# Altium footprint library User.PcbLib: 317 footprints (part 10 of 20)
Each footprint in its own frame and in the unit in brackets; x right, y up, seen from the top. Pads: shape width x height; smd on the part's side, far side on the other; paste and mask are expansions set on the pad; w line width, h text height; cw(c..) or ccw(c..) is an arc to the next point about the centre after c.
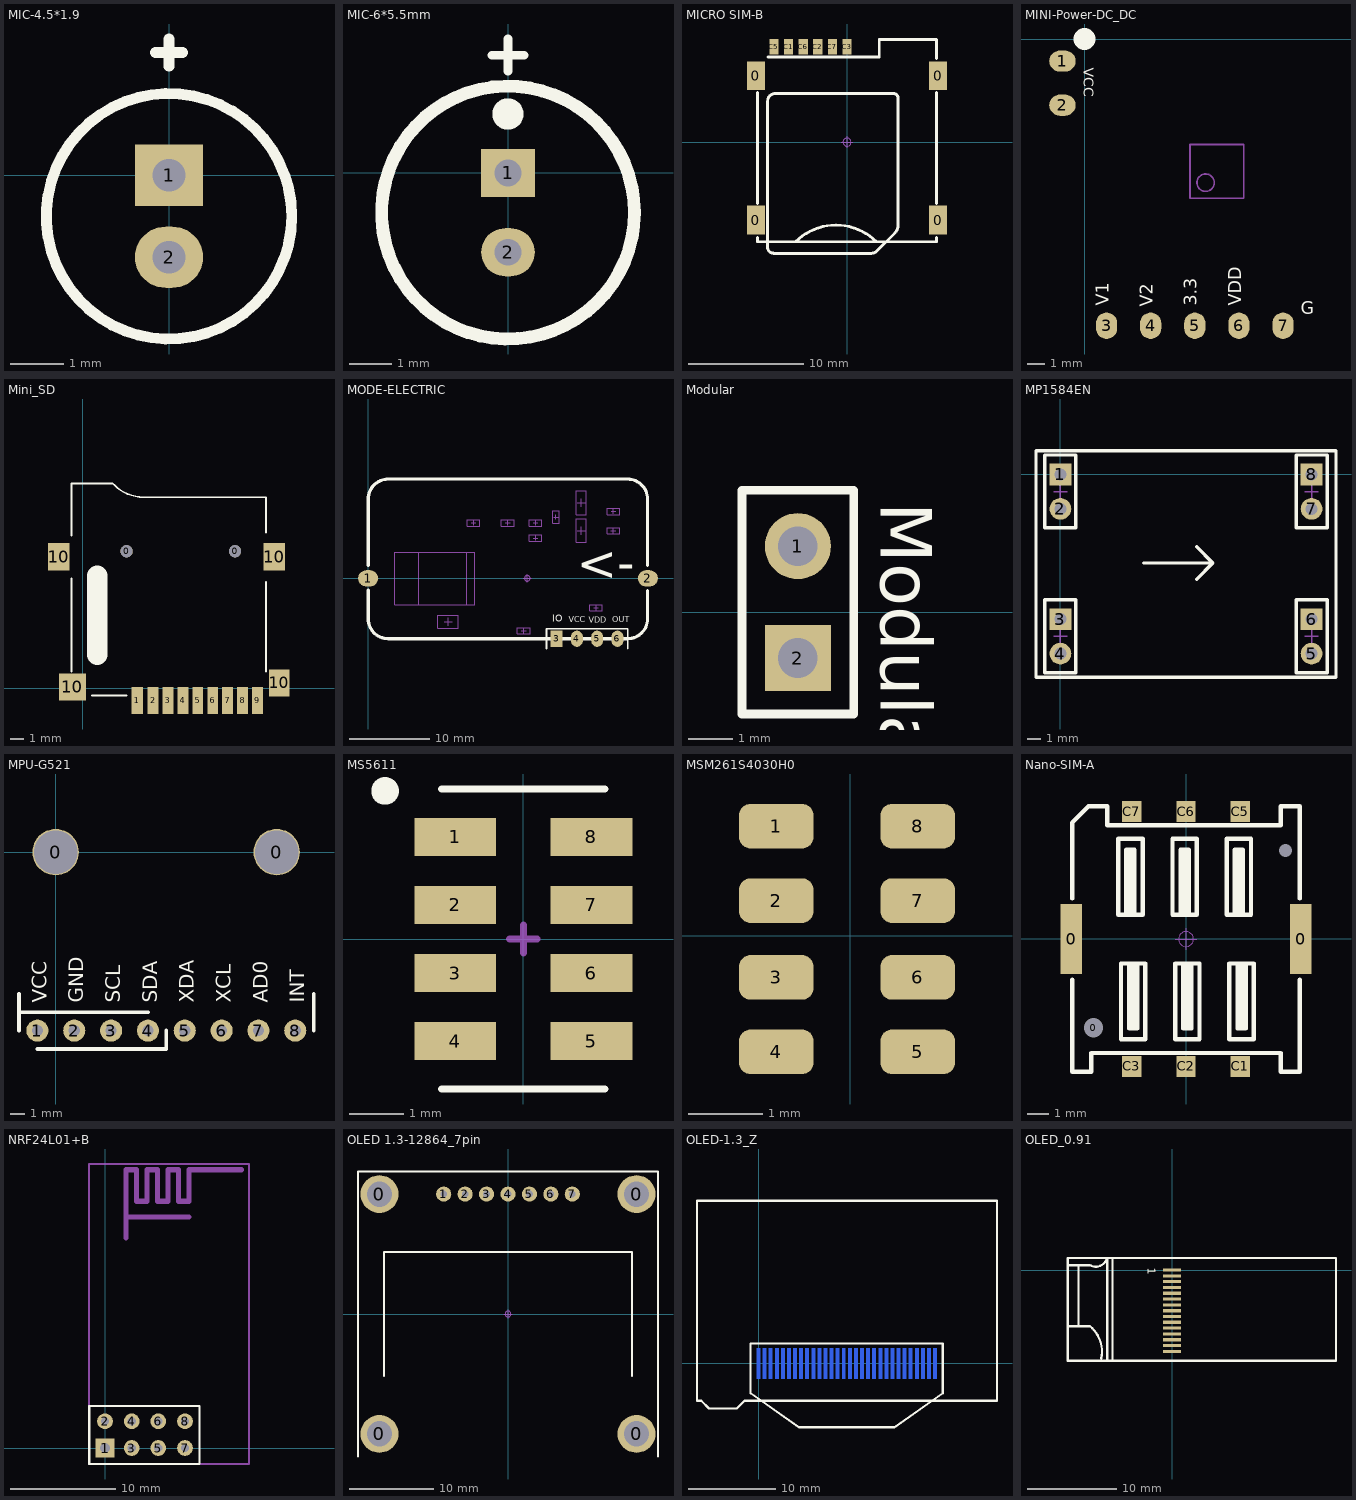
[diagram p9: the footprints below, top view; thin cyan lines are the x and y axes]

## MIC-4.5*1.9 [mil] "咪咪头"
pads (2):
  rect 50x45 hole 24: 1(0,0)
  oval 50x45 hole 24: 2(0,-60)
Top Overlay:
  circle w8: c0,-30 r90
  lines w8: -10,90 10,90 ; 0,80 0,100
3D body "MIC4.5X1.9.stp": height 75.38, standoff -110.24, extent -88.81,-118.58 88,58.58

## MIC-6*5.5mm [mil] "咪咪头"
pads (2):
  rect 50x45 hole 25: 1(0,0)
  oval 50x45 hole 25: 2(0,-74)
Top Overlay:
  circle w15: c0,55 r7.07
  circle w12: c0,-37 r118
  lines w8: -15,110 15,110 ; 0,95 0,125
3D body "MIC6X5.5mm.stp": height 197.64, standoff -118.11, extent -117.78,-157.1 117.78,79.12

## MICRO SIM-B [mm]
pads (10):
  rect 1.55x2.5 smd: 0(-7.9,-6.757) 0(-7.9,5.763) 0(7.9,-6.757) 0(7.9,5.763)
  rect 0.8x1.35 smd: C1(-5.07,8.268) C2(-2.53,8.268) C3(0.01,8.268) C5(-6.34,8.268) C6(-3.8,8.268) C7(-1.26,8.268)
Top Overlay:
  lines w0.254: -7.747,-8.255 -7.747,-8.636 7.747,-8.636 7.747,-8.255 ; -7.747,-5.334 -7.747,4.318 ; -6.858,7.366 2.794,7.366 2.794,8.89 7.747,8.89 7.747,7.239 ; -6.381,-9.636 2.136,-9.636 ccw(c2.136,-9.023) 2.57,-9.456 4.153,-7.873 ccw(c3.502,-7.223) 4.422,-7.223 4.422,-6.334 4.422,3.826 ccw(c4.041,3.826) 4.041,4.207 3.406,4.207 ; -6.381,-9.628 cw(c-6.381,-9.128) -6.881,-9.128 -6.881,3.572 cw(c-6.246,3.572) -6.246,4.207 3.787,4.207 ; -4.445,-8.636 cw(c-0.953,-12.128) 2.54,-8.636 ; 7.747,-5.334 7.747,4.318
Mechanical 15:
  circle w0.05: c0,0 r0.35
  lines w0.05: -0.5,0 0.5,0 ; 0,-0.5 0,0.5
3D body "MICRO SIM-B.STEP": height 1.4, standoff 0.03, extent -8.27,-8.5 8.27,8.72

## MINI-Power-DC_DC [mil] "4 Ch"
pads (7):
  oval 60x48 smd: 1(-50,-50) 2(-50,-150)
  oval 48x60 smd: 3(50,-650) 4(150,-650) 5(250,-650) 6(350,-650) 7(450,-650)
Top Overlay:
  lines w50: 0,0 0,0
  text "VDD" at 365.7,-605 h50
  text "V1" at 65,-605 h50
  text "V2" at 164.86,-606.85 h50
  text "G" at 490.05,-634.54 h50
  text "3.3" at 264.54,-605 h50
  text "VCC" at -9.63,-65 h40
Mechanical 13:
  circle w3.94: c274.41,-325.59 r19.68
  lines w3.94: 238.98,-361.02 238.98,-238.98 361.02,-238.98 361.02,-361.02 238.98,-361.02
3D body: height 19.68, standoff 0, extent -50,-650 650,50
3D body "User Library-0603 SMD Capacitor.STEP": height 31.57, standoff 19.68, extent 574.2,-565.2 605.7,-502.21
3D body "SOD123.STEP": height 69.69, standoff 19.68, extent 58.51,-162.84 121.5,-17.17
3D body "SOT23-5R.STEP": height 70.87, standoff 19.68, extent 410.31,-589.45 528.42,-471.34
3D body "QFN40P300X300X80_HS-21N.step": height 51.18, standoff 19.68, extent 238.58,-361.41 361.41,-238.58
3D body "RESC1608(0603).STEP": height 34.65, standoff 19.68, extent 574.25,-71.49 605.74,-8.5
3D body "RESC1608(0603).STEP": height 34.65, standoff 19.68, extent 98.5,-515.75 161.49,-484.26
3D body "RESC1608(0603).STEP": height 34.65, standoff 19.68, extent 98.5,-445.75 161.49,-414.26
3D body "RESC1608(0603).STEP": height 34.65, standoff 19.68, extent 239.77,-446.77 302.76,-415.27
3D body "RESC1608(0603).STEP": height 34.65, standoff 19.68, extent 437.24,-446.77 500.24,-415.27
3D body "RESC1608(0603).STEP": height 34.65, standoff 19.68, extent 154.25,-162.75 185.74,-99.76
3D body "RESC1608(0603).STEP": height 34.65, standoff 19.68, extent 224.25,-161.49 255.74,-98.5
3D body "LED0603(R).STEP": height 43.31, standoff 19.68, extent 574.26,-201.89 605.75,-138.11
3D body "NR2520.STEP": height 65.75, standoff 22.44, extent 77.29,-370.87 175.71,-292.13
3D body "NR2520.STEP": height 65.75, standoff 22.44, extent 424.29,-370.86 522.71,-292.12
3D body "NR2520.STEP": height 65.75, standoff 22.44, extent 292.12,-175.71 370.86,-77.29
3D body "User Library-0603 SMD Capacitor.STEP": height 31.57, standoff 19.68, extent -5.7,-450.2 25.8,-387.2
3D body "User Library-0603 SMD Capacitor.STEP": height 31.57, standoff 19.68, extent -5.8,-281.8 25.7,-218.81
3D body "User Library-0603 SMD Capacitor.STEP": height 31.57, standoff 19.68, extent 93.8,-245.8 156.8,-214.3
3D body "User Library-0603 SMD Capacitor.STEP": height 31.57, standoff 19.68, extent 414.2,-196.8 445.7,-133.81
3D body "User Library-0603 SMD Capacitor.STEP": height 31.57, standoff 19.68, extent 574.3,-396.2 605.8,-333.2
3D body "User Library-0603 SMD Capacitor.STEP": height 31.57, standoff 19.68, extent 494.2,-197.8 525.7,-134.81
3D body "User Library-0603 SMD Capacitor.STEP": height 31.57, standoff 19.68, extent 334.2,-565.2 365.7,-502.21
3D body "User Library-0603 SMD Capacitor.STEP": height 31.57, standoff 19.68, extent 173.8,-45.8 236.8,-14.3
3D body "User Library-0603 SMD Capacitor.STEP": height 31.57, standoff 19.68, extent 433.2,-65.7 496.19,-34.2

## Mini_SD [mm]
pads (15):
  round 0.9 hole 0.9 unplated: 0(3.251,10.088) 0(11.251,10.088)
  rect 0.85x2 smd: 1(4.051,-0.912)
  rect 0.8x2 smd: 2(5.201,-0.912) 3(6.301,-0.912) 4(7.401,-0.912) 5(8.501,-0.912) 6(9.601,-0.912) 7(10.701,-0.912) 8(11.801,-0.912) 9(12.901,-0.912)
  rect 1.6x2 smd: 10(-1.749,9.688) 10(14.151,9.688)
  rect 2x2 smd: 10(-0.749,0.088)
  rect 1.5x2 smd: 10(14.501,0.388)
Top Overlay:
  lines w0.127: -0.814,11.231 -0.814,14.088 ; -0.814,13.771 -0.814,15.088 2.235,15.088 2.337,14.986 ccw(c4.505,17.154) 4.505,14.088 5.791,14.088 13.537,14.088 13.537,11.485 ; -0.811,1.226 -0.811,8.084 ; 13.54,1.226 13.54,7.83
  lines w0.15: 0.713,-0.552 3.253,-0.552
  lines w1.5: 1.092,2.468 1.092,8.31
3D body "User Library-Micro SD.STEP": height 2.07, standoff -0.4, extent -2.002,-1.152 14.304,14.058

## MODE-ELECTRIC [mil]
pads (6):
  oval 100x80 smd: 1(0,0) 2(1380,0)
  rect 59.06x80 smd: 3(930,-298)
  oval 59.06x80 smd: 4(1030,-298) 5(1130,-298) 6(1230,-298)
Top Overlay:
  lines w7.87: 880,-348 880,-248 1280,-248 1280,-348
  lines w16: 0.51,-199.45 ccw(c98.94,-199.45) 98.94,-297.87 1280.04,-297.87 ccw(c1280.04,-199.45) 1378.46,-199.45 1378.46,-59.45 ; 0.51,-199.33 0.51,-59.33 ; 0.51,63.1 0.51,391.1 cw(c98.94,391.1) 98.94,489.53 1280.04,489.53 cw(c1280.04,391.1) 1378.46,391.1 ; 1378.46,62.99 1378.46,390.99
  text "<-" at 1030,-68.33 h300
  text "OUT" at 1204.05,-227.54 h50
  text "VDD" at 1089,-228 h50
  text "VCC" at 989,-227.54 h50
  text "IO" at 909,-227.44 h60
Mechanical 15:
  circle w1.97: c785,0 r13.78
  lines w1.97: 765.32,0 804.68,0 ; 785,-19.68 785,19.68
  lines w3.94: 249.96,129.53 486.18,129.53 ; 374.53,-213.82 413.9,-213.82 ; 394.21,-233.5 394.21,-194.13 ; 508.07,273.33 531.69,273.33 ; 520,261.52 520,285.14 ; 676.89,273.33 700.51,273.33 ; 688.58,261.52 688.58,285.14 ; 756.54,-258.5 780.16,-258.5 ; 768.23,-270.31 768.23,-246.69 ; 814.13,198.53 837.76,198.53 ; 814.13,273.33 837.76,273.33 ; 826.06,186.72 826.06,210.34 ; 826.06,261.52 826.06,285.14 ; 914.8,302.42 938.43,302.42 ; 926.61,290.73 926.61,314.35 ; 1031.57,235.93 1070.94,235.93 ; 1031.58,373.33 1070.94,373.33 ; 1051.26,216.24 1051.26,255.61 ; 1051.26,353.64 1051.26,393.01 ; 1112.72,-145 1136.34,-145 ; 1124.65,-156.81 1124.65,-133.19 ; 1198.07,235 1221.69,235 ; 1198.31,330 1221.93,330 ; 1210,223.19 1210,246.81 ; 1210,318.19 1210,341.81 ; 249.96,-129.92 249.96,129.92 131.85,129.92 131.85,-129.92 249.96,-129.92 ; 249.96,-129.92 486.18,-129.92 ; 486.18,-129.92 486.18,129.92 525.55,129.92 525.55,-129.92 486.18,-129.92 ; 343.03,-245.31 343.03,-182.32 445.39,-182.32 445.39,-245.31 343.03,-245.31 ; 488.5,257.58 551.5,257.58 551.5,289.08 488.5,289.08 488.5,257.58 ; 657.09,257.58 657.09,289.08 720.08,289.08 720.08,257.58 657.09,257.58 ; 736.73,-274.25 799.72,-274.25 799.72,-242.76 736.73,-242.76 736.73,-274.25 ; 794.57,182.78 857.56,182.78 857.56,214.27 794.57,214.27 794.57,182.78 ; 794.57,257.58 857.56,257.58 857.56,289.08 794.57,289.08 794.57,257.58 ; 910.87,270.93 910.87,333.92 942.36,333.92 942.36,270.93 910.87,270.93 ; 1027.64,176.87 1027.64,294.98 1074.88,294.98 1074.88,176.87 1027.64,176.87 ; 1027.64,314.27 1027.64,432.38 1074.88,432.38 1074.88,314.27 1027.64,314.27 ; 1093.15,-160.75 1156.14,-160.75 1156.14,-129.25 1093.15,-129.25 1093.15,-160.75 ; 1178.5,219.25 1241.5,219.25 1241.5,250.75 1178.5,250.75 1178.5,219.25 ; 1178.5,314.25 1241.5,314.25 1241.5,345.75 1178.5,345.75 1178.5,314.25
3D body "User Library-0603 SMD Capacitor.STEP": height 31.89, standoff 20, extent 1233.8,-160.8 1296.8,-129.3
3D body "User Library-0603 SMD Capacitor.STEP": height 31.89, standoff 20, extent 563.63,-229.52 626.63,-198.02
3D body "User Library-0603 SMD Capacitor.STEP": height 31.89, standoff 20, extent 1178.46,395.03 1241.45,426.53
3D body "SOD123.STEP": height 70, standoff 20, extent 321.38,-245.32 467.05,-182.33
3D body "零": height 52.48, standoff -12.48, extent 612.85,340.16 845.13,517.33
3D body "零": height 52.48, standoff -12.48, extent 179.29,343.12 411.57,520.29
3D body "LED0603(R).STEP": height 43.62, standoff 20, extent 656.69,257.58 720.48,289.08
3D body "SOT23.STEP": height 62.52, standoff 20, extent 998.5,314.28 1102.44,432.39
3D body "TO252AA.STEP": height 110.55, standoff 19.65, extent 151.54,-129.53 533.43,129.53
3D body "SOT23.STEP": height 62.52, standoff 20, extent 1000.08,176.87 1104.02,294.98
3D body "R 2512.STEP": height 41.69, standoff 19.37, extent 659.01,-63 910.98,62.98
3D body "RESC1608(0603).STEP": height 34.96, standoff 20, extent 1093.14,-160.75 1156.14,-129.26
3D body "RESC1608(0603).STEP": height 34.96, standoff 20, extent 736.73,-274.25 799.73,-242.75
3D body "RESC1608(0603).STEP": height 34.96, standoff 20, extent 1178.51,314.26 1241.5,345.75
3D body "RESC1608(0603).STEP": height 34.96, standoff 20, extent 1178.5,219.25 1241.49,250.74
3D body "RESC1608(0603).STEP": height 34.96, standoff 20, extent 910.86,270.93 942.36,333.93
3D body "RESC1608(0603).STEP": height 34.96, standoff 20, extent 794.56,257.58 857.56,289.07
3D body "RESC1608(0603).STEP": height 34.96, standoff 20, extent 488.5,257.58 551.49,289.07
3D body "RESC1608(0603).STEP": height 34.96, standoff 20, extent 794.56,182.77 857.56,214.27
3D body "User Library-SOT-23-6.STEP": height 63, standoff 20, extent 712.64,-206.08 822.64,-110.58
3D body: height 10, standoff 0, extent 5,-298 1370,480

## Modular [mm]
pads (2):
  round 1.5 hole 0.9: 1(-24,1.5)
  rect 1.5x1.5 hole 0.9: 2(-24,-1.04)
Top Overlay:
  lines w0.2: -25.27,-2.31 -25.27,2.77 -22.73,2.77 -22.73,-2.31 -25.27,-2.31
  text "Modular" at -22.5,2.5 h2

## MP1584EN [mm] "MODE"
pads (8):
  rect 1.6x1.6 hole 0.9: 1(0,0) 3(0,-10.66) 6(18.5,-10.66) 8(18.5,0)
  round 1.6 hole 0.9: 2(0,-2.54) 4(0,-13.2) 5(18.5,-13.2) 7(18.5,-2.54)
Top Overlay:
  lines w0.254: 6.147,-6.528 11.227,-6.528 ; 10.033,-7.722 11.227,-6.528 ; 10.033,-5.334 11.227,-6.528 ; -1.8,-14.95 20.3,-14.95 20.3,1.75 -1.8,1.75 -1.8,-14.95 ; -1.143,-14.597 1.143,-14.597 1.143,-9.23 -1.143,-9.23 -1.143,-14.597 ; -1.143,-3.937 1.143,-3.937 1.143,1.43 -1.143,1.43 -1.143,-3.937 ; 17.357,-14.597 19.643,-14.597 19.643,-9.23 17.357,-9.23 17.357,-14.597 ; 17.357,-3.937 19.643,-3.937 19.643,1.43 17.357,1.43 17.357,-3.937
Mechanical 15:
  lines w0.1: -0.5,-11.93 0.5,-11.93 ; -0.5,-1.27 0.5,-1.27 ; 0,-12.43 0,-11.43 ; 0,-1.77 0,-0.77 ; 18,-11.93 19,-11.93 ; 18,-1.27 19,-1.27 ; 18.5,-12.43 18.5,-11.43 ; 18.5,-1.77 18.5,-0.77
3D body: height 12.9, standoff 12.2, extent -1.8,-14.95 20.3,1.75
3D body "Header-F-2.54X2.stp": height 8.5, standoff -3.2, extent 17.25,-14.595 19.75,-9.265
3D body "Header-F-2.54X2.stp": height 8.6, standoff -3.1, extent 17.25,-3.935 19.75,1.395
3D body "Header-F-2.54X2.stp": height 8.5, standoff -3.2, extent -1.25,-14.595 1.25,-9.265
3D body "Header-F-2.54X2.stp": height 8.6, standoff -3.1, extent -1.25,-3.935 1.25,1.395
3D body "Capacitor 1206 SMD1.step": height 14, standoff 13, extent 17.7,-8.2 19.3,-5
3D body "Capacitor 1206 SMD1.step": height 14, standoff 13, extent -0.8,-8.2 0.8,-5
3D body "MSOP-8.STEP": height 14.15, standoff 13, extent 4.647,-8.978 7.647,-4.078
3D body "DI-214AA(SMB).step": height 15.45, standoff 13.03, extent 2.279,-2.865 7.779,1.035
3D body "HEADER 2.54X2.stp": height -4.3, standoff -15.5, extent -1.27,-3.937 1.229,1.143
3D body "HEADER 2.54X2.stp": height -4.3, standoff -15.5, extent -1.27,-14.597 1.229,-9.517
3D body "HEADER 2.54X2.stp": height -4.3, standoff -15.5, extent 17.23,-14.597 19.729,-9.517
3D body "HEADER 2.54X2.stp": height -4.3, standoff -15.5, extent 17.23,-3.937 19.729,1.143
3D body "Iductor-CDRH-74.step": height 17.3, standoff 12.8, extent 8.822,-9.715 16.222,-1.715

## MPU-G521 [mil]
pads (10):
  round 125.98 hole 118.11: 0(0,0) 0(600,0)
  round 60 hole 30: 1(-49.61,-484.25) 2(50.39,-484.25) 3(150.39,-484.25) 4(250.39,-484.25) 5(350.39,-484.25) 6(450.39,-484.25) 7(550.39,-484.25) 8(650.39,-484.25)
Top Overlay:
  lines w10: -99.61,-484.25 -99.61,-384.25 ; -99.61,-434.25 250.39,-434.25 ; -49.61,-534.25 300.39,-534.25 300.39,-484.25 ; 700.39,-484.25 700.39,-384.25
  text "INT" at 675.39,-409.25 h39.37
  text "SDA" at 275.39,-409.25 h39.37
  text "SCL" at 175.39,-409.25 h39.37
  text "GND" at 75.39,-409.25 h39.37
  text "VCC" at -24.61,-409.25 h39.37
  text "XDA" at 375.39,-409.25 h39.37
  text "XCL" at 475.39,-409.25 h39.37
  text "AD0" at 575.39,-409.25 h39.37
3D body "CAP-R.STEP": height 486.03, standoff 432.88, extent 256.1,-2.59 344.69,50.56
3D body "Header-F-2.54X8.stp": height 338.58, standoff -122.05, extent -104.53,-533.86 705.31,-435.43
3D body "QFN24-4X4.STEP": height 490.16, standoff 450.79, extent 221.27,-295.66 379.53,-137.4
3D body "M3x11+6.STEP": height -17.71, standoff -687.01, extent 493.77,-92.52 706.22,92.52
3D body "M3x11+6.STEP": height -17.71, standoff -687.01, extent -106.23,-92.52 106.22,92.52
3D body: height 452.76, standoff 433.07, extent -99.61,-531.5 696.85,98.43
3D body "M3x4.STEP": height 651.58, standoff 494.09, extent 493.78,-92.51 706.23,92.52
3D body "User Library-0603 SMD Capacitor.STEP": height 464.65, standoff 452.76, extent -98.49,-98.74 -35.49,-67.25
3D body "SOT23-5R.STEP": height 503.94, standoff 452.76, extent -83.66,-295.05 34.45,-176.94

## MS5611 [mm] "气压传感芯片"
pads (8):
  rect 1.5x0.7 smd: 1(-1.25,1.875) 2(-1.25,0.625) 3(-1.25,-0.625) 4(-1.25,-1.875) 5(1.25,-1.875) 6(1.25,-0.625) 7(1.25,0.625) 8(1.25,1.875)
Top Overlay:
  circle w0.454: c-2.54,2.718 r0.025
  lines w0.127: -1.5,-2.754 1.5,-2.754 ; -1.5,2.754 1.5,2.754
Mechanical 15:
  lines w0.127: -0.254,0 0.254,0 ; 0,-0.254 0,0.254
3D body "SM5611.STEP": height 1, standoff -0.01, extent -1.5,-2.5 1.501,2.5

## MSM261S4030H0 [mm]
pads (8):
  rrect50% 1x0.6 smd: 1(-0.991,1.473) 2(-0.991,0.473) 3(-0.991,-0.559) 4(-0.991,-1.559) 5(0.909,-1.559) 6(0.909,-0.559) 7(0.909,0.473) 8(0.909,1.473)
3D body "Maix_GO.stp": height 1.06, standoff 0, extent -1.526,-2.048 1.474,1.952

## Nano-SIM-A [mm]
pads (10):
  rect 1x3.29 smd: 0(-5.385,-0.025) 0(5.385,-0.025)
  round 0.6 hole 0.9: 0(-4.34,-4.175)
  round 0 hole 0.6: 0(4.66,4.125)
  rect 0.9x1 smd: C1(2.54,-5.995) C2(0,-5.995) C3(-2.54,-5.995) C5(2.54,5.955) C6(0,5.955) C7(-2.54,5.955)
Top Overlay:
  lines w0.203: -5.334,-1.93 -5.334,-6.248 -4.445,-6.248 -4.445,-5.359 4.445,-5.359 4.445,-6.248 5.334,-6.248 5.334,-1.93 ; -5.334,1.88 -5.334,5.436 -4.572,6.198 -3.683,6.198 -3.683,5.309 4.445,5.309 4.445,6.198 5.334,6.198 5.334,1.88 ; -2.794,1.118 -2.794,4.166 -2.413,4.166 -2.413,1.118 ; -2.667,-1.168 -2.667,-4.216 -2.286,-4.216 -2.286,-1.168 ; -2.667,1.118 -2.667,4.039 ; -2.54,-4.216 -2.54,-1.168 ; -2.54,1.118 -2.54,4.166 ; -2.413,-4.089 -2.413,-1.168 ; -0.254,1.118 -0.254,4.166 0.127,4.166 0.127,1.118 ; -0.127,-1.168 -0.127,-4.216 0.254,-4.216 0.254,-1.168 ; -0.127,1.118 -0.127,4.039 ; 0,-4.216 0,-1.168 ; 0,1.118 0,4.166 ; 0.127,-4.089 0.127,-1.168 ; 2.286,1.118 2.286,4.166 2.667,4.166 2.667,1.118 ; 2.413,-1.168 2.413,-4.216 2.794,-4.216 2.794,-1.168 ; 2.413,1.118 2.413,4.039 ; 2.54,-4.216 2.54,-1.168 ; 2.54,1.118 2.54,4.166 ; 2.667,-4.089 2.667,-1.168 ; -3.175,1.118 -3.175,4.674 -2.032,4.674 -2.032,1.118 -3.175,1.118 ; -3.048,-4.724 -3.048,-1.168 -1.905,-1.168 -1.905,-4.724 -3.048,-4.724 ; -0.635,1.118 0.508,1.118 0.508,4.674 -0.635,4.674 -0.635,1.118 ; -0.508,-4.724 -0.508,-1.168 0.635,-1.168 0.635,-4.724 -0.508,-4.724 ; 1.905,1.118 3.048,1.118 3.048,4.674 1.905,4.674 1.905,1.118 ; 2.032,-4.724 3.175,-4.724 3.175,-1.168 2.032,-1.168 2.032,-4.724
Mechanical 15:
  circle w0.05: c0,-0.025 r0.35
  lines w0.05: -0.5,-0.025 0.5,-0.025 ; 0,-0.525 0,0.475
3D body "Nano-SIM-A.STEP": height 1.45, standoff -0.25, extent -5.685,-6.175 5.685,6.125

## NRF24L01+B [mm] "2.4G无线模块"
pads (8):
  rect 1.8x1.8 hole 1: 1(0,0)
  round 1.5 hole 0.8: 2(0,2.54) 3(2.54,0) 4(2.54,2.54) 5(5.08,0) 6(5.08,2.54) 7(7.62,0) 8(7.62,2.54)
Top Overlay:
  lines w0.203: -1.5,-1.5 -1.476,-1.524 9,-1.524 9,4 -1.5,4 -1.5,-1.5
Mechanical 15:
  lines w0.203: -1.524,-1.524 -1.524,27.051 13.716,27.051 13.716,-1.524 -1.524,-1.524
  lines w0.5: 2,20 2,26.5 3,26.5 3,23.5 4,23.5 4,26.5 5,26.5 5,23.5 6,23.5 6,26.5 7,26.5 7,23.5 8,23.5 8,26.5 13,26.5 ; 2,22 8,22
3D body "NRF24L01+B.STEP": height 15.44, standoff -3.03, extent -1.5,-1.5 13.7,27

## OLED 1.3-12864_7pin [mm] "长：35.4mm，宽：33.5mm，"
pads (11):
  round 4.5 hole 3: 0(-15.24,-14.21) 0(-15.24,14.21) 0(15.24,-14.21) 0(15.24,14.21)
  round 1.8 hole 0.8: 1(-7.62,14.21) 2(-5.08,14.21) 3(-2.54,14.21) 4(0,14.21) 5(2.54,14.21) 6(5.08,14.21) 7(7.62,14.21)
Top Overlay:
  lines w0.2: -17.78,-16.891 -17.78,16.891 17.78,16.891 17.78,-16.891 ; -14.7,-7.35 -14.7,7.35 14.7,7.35 14.7,-7.35
Mechanical 15:
  circle w0.05: c0,0 r0.35
  lines w0.05: -0.5,0 0.5,0 ; 0,-0.5 0,0.5
3D body "OLED 1.3-12864_7pin.STEP": height 5.5, standoff -6.02, extent -17.7,-16.75 17.7,16.75

## OLED-1.3_Z [mm]
pads (30):
  rect 0.4x3.5 smd far side: 1(0,0) 2(0.7,0) 3(1.4,0) 4(2.1,0) 5(2.8,0) 6(3.5,0) 7(4.2,0) 8(4.9,0) 9(5.6,0) 10(6.3,0) 11(7,0) 12(7.7,0) 13(8.4,0) 14(9.1,0) 15(9.8,0) 16(10.5,0) 17(11.2,0) 18(11.9,0) 19(12.6,0) 20(13.3,0) 21(14,0) 22(14.7,0) 23(15.4,0) 24(16.1,0) 25(16.8,0) 26(17.5,0) 27(18.2,0) 28(18.9,0) 29(19.6,0) 30(20.3,0)
Top Overlay:
  lines w0.254: -7.075,-4.293 -7.075,18.722 27.425,18.722 27.425,-4.293 -1.62,-4.293 -2.509,-5.182 -5.684,-5.182 -6.573,-4.293 -7.075,-4.293 ; -0.909,-3.429 4.679,-7.341 15.601,-7.341 21.189,-3.429 21.189,2.286 -0.909,2.286 -0.909,-3.429
3D body "User Library-OLED-1_3C.step": height 4.65, standoff -0.07, extent -7.075,-7.367 27.425,18.722

## OLED_0.91 [mm]
pads (15):
  rect 2x0.35 smd: 1(0,0) 2(-0.001,-0.652) 3(0.005,-1.302) 4(-0.003,-1.952) 5(0,-2.6) 6(0,-3.25) 7(0,-3.9) 8(0,-4.55) 9(0,-5.2) 10(0,-5.85) 11(0,-6.5) 12(0,-7.15) 13(0,-7.8) 14(0,-8.45) 15(0,-9.1)
Top Overlay:
  lines w0.254: -11.663,-6.283 -9.223,-6.283 ; -11.663,0.537 -9.223,0.537 ; -10.463,-6.283 -10.463,0.567 ; -9.183,0.557 ccw(c-8.52,1.681) -7.263,1.327 ; -9.173,-6.293 cw(c-11.535,-9.134) -7.913,-9.863 ; -7.266,-10.14 -7.266,1.317 ; -7.223,-10.15 -0.703,-10.15 ; -6.663,-10.14 -6.664,1.36 ; 18.337,-10.14 -11.663,-10.14 -11.663,1.36 18.337,1.36 ; 18.357,-10.16 18.357,1.34
  text "1" at -3.072,0.253 h1.52
3D body: height 0.8, standoff 0.3, extent -11.663,-10.14 -6.663,1.36
3D body: height 0.6, standoff 0.3, extent -11.663,-10.14 18.337,1.36
3D body: height 0.8, standoff 0.3, extent -6.264,-9.64 17.837,0.91